# Altium footprint library Miscellaneous THD.PcbLib: 216 footprints (part 7 of 15)
Each footprint in its own frame and in the unit in brackets; x right, y up, seen from the top. Pads: shape width x height; smd on the part's side, far side on the other; paste and mask are expansions set on the pad; w line width, h text height; cw(c..) or ccw(c..) is an arc to the next point about the centre after c.
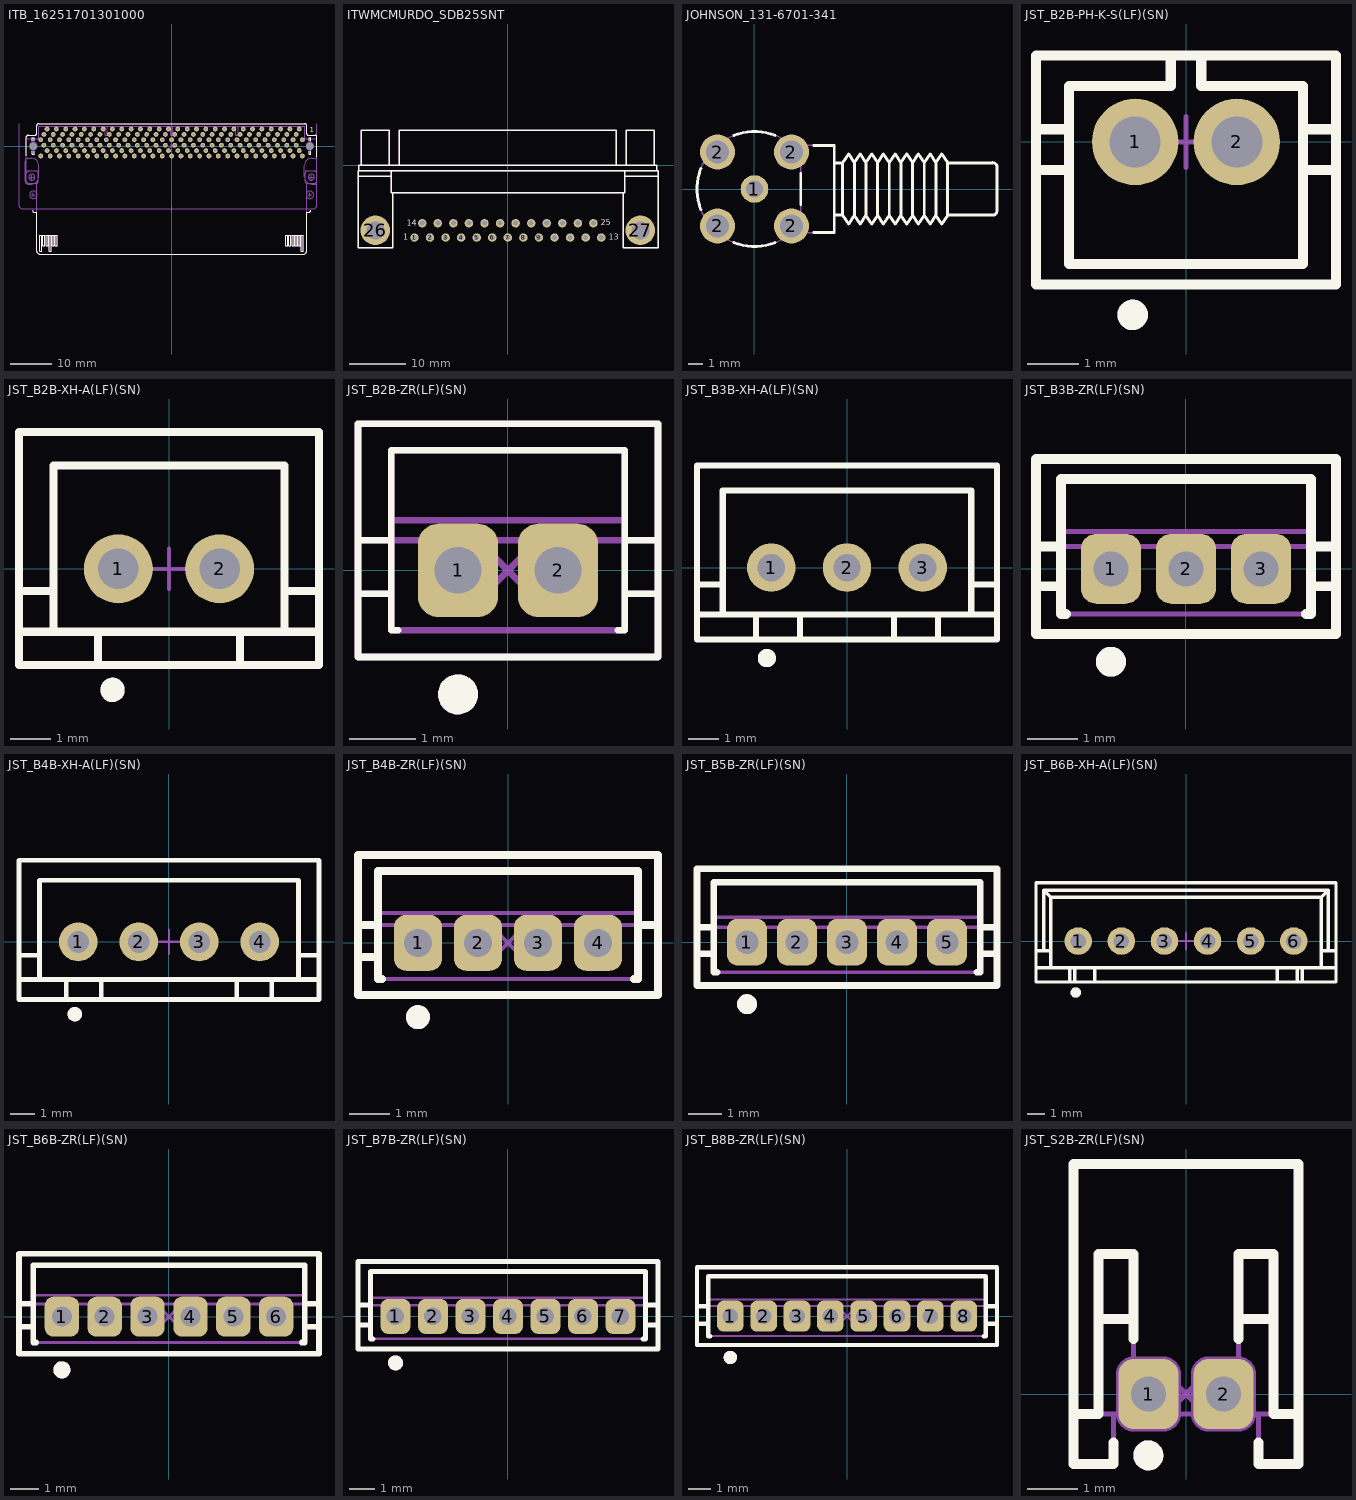
[diagram p6: the footprints below, top view; thin cyan lines are the x and y axes]

## ITB_16251701301000 [mm] "170 Poles, Piggyback Plug Connector (Basic Side)"
height 7.64
pads (172):
  round 1.15 hole 0.55: 1(31.5,1.5) 2(30.75,4.1) 3(30,2.8) 4(29.25,1.5) 5(28.5,4.1) 6(27.75,2.8) 7(27,1.5) 8(26.25,4.1) 9(25.5,2.8) 10(24.75,1.5) 11(24,4.1) 12(23.25,2.8) 13(22.5,1.5) 14(21.75,4.1) 15(21,2.8) 16(20.25,1.5) 17(19.5,4.1) 18(18.75,2.8) 19(18,1.5) 20(17.25,4.1) 21(16.5,2.8) 22(15.75,1.5) 23(15,4.1) 24(14.25,2.8) 25(13.5,1.5) 26(12.75,4.1) 27(12,2.8) 28(11.25,1.5) 29(10.5,4.1) 30(9.75,2.8) 31(9,1.5) 32(8.25,4.1) 33(7.5,2.8) 34(6.75,1.5) 35(6,4.1) 36(5.25,2.8) 37(4.5,1.5) 38(3.75,4.1) 39(3,2.8) 40(2.25,1.5) 41(1.5,4.1) 42(0.75,2.8) 43(0,1.5) 44(-0.75,4.1) 45(-1.5,2.8) 46(-2.25,1.5) 47(-3,4.1) 48(-3.75,2.8) 49(-4.5,1.5) 50(-5.25,4.1) 51(-6,2.8) 52(-6.75,1.5) 53(-7.5,4.1) 54(-8.25,2.8) 55(-9,1.5) 56(-9.75,4.1) 57(-10.5,2.8) 58(-11.25,1.5) 59(-12,4.1) 60(-12.75,2.8) 61(-13.5,1.5) 62(-14.25,4.1) 63(-15,2.8) 64(-15.75,1.5) 65(-16.5,4.1) 66(-17.25,2.8) 67(-18,1.5) 68(-18.75,4.1) 69(-19.5,2.8) 70(-20.25,1.5) 71(-21,4.1) 72(-21.75,2.8) 73(-22.5,1.5) 74(-23.25,4.1) 75(-24,2.8) 76(-24.75,1.5) 77(-25.5,4.1) 78(-26.25,2.8) 79(-27,1.5) 80(-27.75,4.1) 81(-28.5,2.8) 82(-29.25,1.5) 83(-30,4.1) 84(-30.75,2.8) 85(-31.5,1.5) 86(-31.5,-2.4) 87(-30.75,0.2) 88(-30,-1.1) 89(-29.25,-2.4) 90(-28.5,0.2) 91(-27.75,-1.1) 92(-27,-2.4) 93(-26.25,0.2) 94(-25.5,-1.1) 95(-24.75,-2.4) 96(-24,0.2) 97(-23.25,-1.1) 98(-22.5,-2.4) 99(-21.75,0.2) 100(-21,-1.1) 101(-20.25,-2.4) 102(-19.5,0.2) 103(-18.75,-1.1) 104(-18,-2.4) 105(-17.25,0.2) 106(-16.5,-1.1) 107(-15.75,-2.4) 108(-15,0.2) 109(-14.25,-1.1) 110(-13.5,-2.4) 111(-12.75,0.2) 112(-12,-1.1) 113(-11.25,-2.4) 114(-10.5,0.2) 115(-9.75,-1.1) 116(-9,-2.4) 117(-8.25,0.2) 118(-7.5,-1.1) 119(-6.75,-2.4) 120(-6,0.2) 121(-5.25,-1.1) 122(-4.5,-2.4) 123(-3.75,0.2) 124(-3,-1.1) 125(-2.25,-2.4) 126(-1.5,0.2) 127(-0.75,-1.1) 128(0,-2.4) 129(0.75,0.2) 130(1.5,-1.1) 131(2.25,-2.4) 132(3,0.2) 133(3.75,-1.1) 134(4.5,-2.4) 135(5.25,0.2) 136(6,-1.1) 137(6.75,-2.4) 138(7.5,0.2) 139(8.25,-1.1) 140(9,-2.4) 141(9.75,0.2) 142(10.5,-1.1) 143(11.25,-2.4) 144(12,0.2) 145(12.75,-1.1) 146(13.5,-2.4) 147(14.25,0.2) 148(15,-1.1) 149(15.75,-2.4) 150(16.5,0.2) 151(17.25,-1.1) 152(18,-2.4) 153(18.75,0.2) 154(19.5,-1.1) 155(20.25,-2.4) 156(21,0.2) 157(21.75,-1.1) 158(22.5,-2.4) 159(23.25,0.2) 160(24,-1.1) 161(24.75,-2.4) 162(25.5,0.2) 163(26.25,-1.1) 164(27,-2.4) 165(27.75,0.2) 166(28.5,-1.1) 167(29.25,-2.4) 168(30,0.2) 169(30.75,-1.1) 170(31.5,-2.4)
  round 1 hole 1.8 unplated mask+0.4: 171(-33.3,0) 172(33.3,0)
Top Overlay:
  lines w0.2: -34.95,-2.3 -34.95,2.2 cw(c-34.55,2.2) -34.55,2.6 -32.926,2.596 ccw(c-32.931,3.003) -32.525,3 -32.525,4.9 cw(c-32.025,4.9) -32.025,5.4 32.025,5.4 cw(c32.025,4.9) 32.525,4.9 32.525,3 ccw(c32.925,3) 32.925,2.6 34.55,2.6 cw(c34.55,2.2) 34.95,2.2 34.95,-2.75 ; -33.5,-15.5 ccw(c-33,-15.5) -33,-16 -32.525,-16 -32.525,-25.293 ccw(c-32.025,-25.293) -32.379,-25.646 -32.026,-25.994 ccw(c-31.718,-25.6) -31.718,-26.1 31.718,-26.1 ccw(c31.718,-25.6) 32.026,-25.994 32.379,-25.646 ccw(c32.025,-25.293) 32.525,-25.293 32.525,-16 33,-16 ccw(c33,-15.5) 33.5,-15.5 ; -33.5,-1.234 -33.5,-2 -33.1,-2 -33.1,-1.234 ; -33.5,1.234 -33.5,2 -33.1,2 -33.1,1.234 ; 33.1,-1.234 33.1,-2 33.5,-2 33.5,-1.234 ; 33.1,1.234 33.1,2 33.5,2 33.5,1.234 ; -31.74,-25.38 -31.26,-25.38 -31.26,-21.468 -31.74,-21.468 -31.74,-25.38 ; -30.99,-23.98 -30.51,-23.98 -30.51,-21.468 -30.99,-21.468 -30.99,-23.98 ; -30.24,-23.98 -30.24,-21.468 -29.76,-21.468 -29.76,-23.98 -30.24,-23.98 ; -29.49,-25.38 -29.49,-21.468 -29.01,-21.468 -29.01,-25.38 -29.49,-25.38 ; -28.74,-23.98 -28.26,-23.98 -28.26,-21.468 -28.74,-21.468 -28.74,-23.98 ; -27.99,-23.98 -27.99,-21.468 -27.51,-21.468 -27.51,-23.98 -27.99,-23.98 ; 27.51,-23.98 27.99,-23.98 27.99,-21.468 27.51,-21.468 27.51,-23.98 ; 28.26,-23.98 28.74,-23.98 28.74,-21.468 28.26,-21.468 28.26,-23.98 ; 29.01,-23.98 29.49,-23.98 29.49,-21.468 29.01,-21.468 29.01,-23.98 ; 29.76,-23.98 30.24,-23.98 30.24,-21.468 29.76,-21.468 29.76,-23.98 ; 30.51,-23.98 30.99,-23.98 30.99,-21.468 30.51,-21.468 30.51,-23.98 ; 31.26,-25.38 31.74,-25.38 31.74,-21.468 31.26,-21.468 31.26,-25.38
  text "1" at 33.25,3.3 h1.2
Mechanical 8:
  drawing of 735 lines, arcs and shapes, not listed
  text "PCB Edge" at -5.2,-14.4 h1.52
  text "167" at 29.553,-2.214 h0.5
  text "170" at 31.69,-2.201 h0.5
  text "169" at 30.879,-0.767 h0.5
  text "168" at 30.244,0.414 h0.5
  text "1" at 31.62,1.758 h0.5
  text "4" at 29.53,1.748 h0.5
  text "3" at 30.339,3.029 h0.5
  text "2" at 31.189,4.373 h0.5
  text "82" at -28.854,1.645 h0.5
  text "83" at -29.713,4.371 h0.5
  text "84" at -30.367,2.938 h0.5
  text "85" at -31.097,1.636 h0.5
  text "87" at -30.405,0.369 h0.5
  text "88" at -29.75,-0.85 h0.5
  text "89" at -28.931,-2.226 h0.5
  text "86" at -31.156,-2.186 h0.5
Mechanical 14:
  circle w0.1: c33.645,-7.5 r0.735
  circle w0.1: c-33.645,-7.5 r0.735
  lines w0.1: -34.95,-6.5 cw(c-34.45,-6.5) -34.45,-6 -32.65,-6 cw(c-32.65,-6.5) -32.15,-6.5 -32.15,-8.5 cw(c-32.65,-8.5) -32.65,-9 -34.45,-9 cw(c-34.45,-8.5) -34.95,-8.5 -34.95,2.2 cw(c-34.55,2.2) -34.55,2.6 -32.926,2.596 ccw(c-32.931,3.003) -32.525,3 -32.525,4.9 cw(c-32.025,4.9) -32.025,5.4 32.025,5.4 cw(c32.025,4.9) 32.525,4.9 32.525,3 ccw(c32.925,3) 32.925,2.6 34.55,2.6 cw(c34.55,2.2) 34.95,2.2 34.95,-8.5 cw(c34.45,-8.5) 34.45,-9 32.65,-9 cw(c32.65,-8.5) 32.15,-8.5 32.15,-6.5 cw(c32.65,-6.5) 32.65,-6 34.45,-6 cw(c34.45,-6.5) 34.95,-6.5 ; -34.95,1.784 -33.5,1.784 ; -33.1,1.784 -32.025,1.784 -32.025,4.8 32.025,4.8 32.025,1.784 33.1,1.784 ; -32.825,-9 cw(c-32.825,-9.3) -32.525,-9.3 -32.525,-25.293 ccw(c-32.025,-25.293) -32.379,-25.646 -32.026,-25.994 ccw(c-31.718,-25.6) -31.718,-26.1 31.718,-26.1 ccw(c31.718,-25.6) 32.026,-25.994 32.379,-25.646 ccw(c32.025,-25.293) 32.525,-25.293 32.525,-9.3 cw(c32.825,-9.3) 32.825,-9 ; -16,4.779 -16,2.546 -15.5,2.546 -15.5,4.8 ; -0.25,4.8 -0.25,2.546 0.25,2.546 0.25,4.8 ; 15.5,4.8 15.5,2.546 16,2.546 16,4.8 ; 33.5,1.784 34.95,1.784 ; -33.5,-2 -33.1,-2 -33.1,2 -33.5,2 -33.5,-2 ; -31.74,-25.38 -31.74,-21.468 -31.26,-21.468 -31.26,-25.38 -31.74,-25.38 ; -30.99,-23.98 -30.99,-21.468 -30.51,-21.468 -30.51,-23.98 -30.99,-23.98 ; -30.24,-23.98 -29.76,-23.98 -29.76,-21.468 -30.24,-21.468 -30.24,-23.98 ; -29.49,-25.38 -29.01,-25.38 -29.01,-21.468 -29.49,-21.468 -29.49,-25.38 ; -28.74,-23.98 -28.74,-21.468 -28.26,-21.468 -28.26,-23.98 -28.74,-23.98 ; -27.99,-23.98 -27.51,-23.98 -27.51,-21.468 -27.99,-21.468 -27.99,-23.98 ; 27.51,-23.98 27.51,-21.468 27.99,-21.468 27.99,-23.98 27.51,-23.98 ; 28.26,-23.98 28.26,-21.468 28.74,-21.468 28.74,-23.98 28.26,-23.98 ; 29.01,-23.98 29.01,-21.468 29.49,-21.468 29.49,-23.98 29.01,-23.98 ; 29.76,-23.98 29.76,-21.468 30.24,-21.468 30.24,-23.98 29.76,-23.98 ; 30.51,-23.98 30.51,-21.468 30.99,-21.468 30.99,-23.98 30.51,-23.98 ; 31.26,-25.38 31.26,-21.468 31.74,-21.468 31.74,-25.38 31.26,-25.38 ; 33.1,-2 33.1,2 33.5,2 33.5,-2 33.1,-2
  text "1" at 33.25,3.3 h1.2
3D body "ITB_16251701301000.stp": height 7.59, standoff -2.63, extent -34.95,-26.1 34.95,5.4

## ITWMCMURDO_SDB25SNT [mm] "25 Way Right Angled Female D-sub Connector"
height 12.5
pads (27):
  round 1.5 hole 0.9: 1(-16.56,-12.84) 2(-13.8,-12.84) 3(-11.04,-12.84) 4(-8.28,-12.84) 5(-5.52,-12.84) 6(-2.76,-12.84) 7(0,-12.84) 8(2.76,-12.84) 9(5.52,-12.84) 10(8.28,-12.84) 11(11.04,-12.84) 12(13.8,-12.84) 13(16.56,-12.84) 14(-15.18,-10.3) 15(-12.42,-10.3) 16(-9.66,-10.3) 17(-6.9,-10.3) 18(-4.14,-10.3) 19(-1.38,-10.3) 20(1.38,-10.3) 21(4.14,-10.3) 22(6.9,-10.3) 23(9.66,-10.3) 24(12.42,-10.3) 25(15.18,-10.3)
  round 5.25 hole 3.2: 26(-23.5,-11.57) 27(23.5,-11.57)
Top Overlay:
  lines w0.254: -26.571,-2 -20.671,-2 ; -26.45,-1 -26.45,0 26.45,0 26.45,-1 ; -26,0 -26,6.2 -21,6.2 -21,0 ; -20.671,-1 -20.671,-4.9 20.729,-4.9 20.729,-1 ; -20.371,-4.9 -20.371,-14.67 -26.571,-14.67 -26.571,-1 26.629,-1 26.629,-14.67 20.429,-14.67 20.429,-4.9 ; -19.25,0 -19.25,6.2 19.25,6.2 19.25,0 ; 20.729,-2 26.629,-2 ; 21,0 21,6.2 26,6.2 26,0
  text "1" at -18.542,-13.208 h1.02
  text "13" at 17.907,-13.208 h1.02
  text "14" at -17.907,-10.795 h1.02
  text "25" at 16.51,-10.668 h1.02
Mechanical 14:
  lines w0.1: -26.571,-2 -20.671,-2 ; -26.45,-1 -26.45,0 26.45,0 26.45,-1 ; -26,0 -26,6.2 -21,6.2 -21,0 ; -20.671,-1 -20.671,-4.9 20.729,-4.9 20.729,-1 ; -20.371,-4.9 -20.371,-14.67 -26.571,-14.67 -26.571,-1 26.629,-1 26.629,-14.67 20.429,-14.67 20.429,-4.9 ; -19.25,0 -19.25,6.2 19.25,6.2 19.25,0 ; 20.729,-2 26.629,-2 ; 21,0 21,6.2 26,6.2 26,0
  text "1" at -18.542,-13.208 h1.02
  text "13" at 17.907,-13.208 h1.02
  text "14" at -17.907,-10.795 h1.02
  text "25" at 16.51,-10.668 h1.02
3D body "ITWMCMURDO_SDB25SNT.stp": height 12.93, standoff -5, extent -26.71,-14.67 26.71,6.2

## JOHNSON_131-6701-341 [mm] "Right Angle Bulkhead SMC"
height 7.67
pads (5):
  round 1.9 hole 1.2: 1(0,0)
  round 2.4 hole 1.6: 2(-2.54,-2.54) 2(-2.54,2.54) 2(2.54,-2.54) 2(2.54,2.54)
Top Overlay:
  lines w0.2: -3.685,-1.422 cw(c0,0) -3.685,1.422 ; -1.422,-3.685 ccw(c0,0) 1.422,-3.685 ; -1.422,3.685 cw(c0,0) 1.422,3.685 ; 3.18,-1.074 3.18,1.074 ; 4.072,-3 5.48,-3 5.48,3 4.072,3 ; 5.48,-1.8 6.06,-1.8 ; 5.48,1.8 6.06,1.8 ; 6.86,1.8 6.86,-1.81 ; 7.66,1.8 7.66,-1.81 ; 8.46,1.8 8.46,-1.81 ; 9.26,1.8 9.26,-1.81 ; 10.06,1.8 10.06,-1.81 ; 10.86,1.8 10.86,-1.81 ; 11.66,1.8 11.66,-1.81 ; 12.46,1.8 12.46,-1.81 ; 13.26,-1.8 16.36,-1.8 ccw(c16.36,-1.5) 16.66,-1.5 16.66,1.5 ccw(c16.36,1.507) 16.296,1.8 ; 13.26,1.81 12.86,2.41 12.46,1.81 12.06,2.41 11.66,1.81 11.26,2.41 10.86,1.81 10.46,2.41 10.06,1.81 9.66,2.41 9.26,1.81 8.86,2.41 8.46,1.81 8.06,2.41 7.66,1.81 7.26,2.41 6.86,1.81 6.46,2.41 6.06,1.81 6.06,-1.81 6.46,-2.41 6.86,-1.81 ; 16.36,1.8 13.26,1.8 13.26,-1.81 12.86,-2.41 12.46,-1.81 ; 6.86,-1.81 7.26,-2.41 7.66,-1.81 ; 7.66,-1.81 8.06,-2.41 8.46,-1.81 ; 8.46,-1.81 8.86,-2.41 9.26,-1.81 ; 9.26,-1.81 9.66,-2.41 10.06,-1.81 ; 10.06,-1.81 10.46,-2.41 10.86,-1.81 ; 10.86,-1.81 11.26,-2.41 11.66,-1.81 ; 11.66,-1.81 12.06,-2.41 12.46,-1.81
Mechanical 8:
  lines w0.1: -3.04,-2.54 -2.54,-2.54 ; -3.04,2.54 -2.54,2.54 ; -2.54,-3.04 -2.54,-2.54 ; -2.54,-2.04 -2.54,-2.54 ; -2.54,2.04 -2.54,2.54 ; -2.54,3.04 -2.54,2.54 ; -2.04,-2.54 -2.54,-2.54 ; -2.04,2.54 -2.54,2.54 ; -0.5,0 0,0 ; 0,-0.5 0,0 ; 0,0.5 0,0 ; 0.5,0 0,0 ; 2.04,-2.54 2.54,-2.54 ; 2.04,2.54 2.54,2.54 ; 2.54,-3.04 2.54,-2.54 ; 2.54,-2.04 2.54,-2.54 ; 2.54,2.04 2.54,2.54 ; 2.54,3.04 2.54,2.54 ; 3.04,-2.54 2.54,-2.54 ; 3.04,2.54 2.54,2.54
Mechanical 14:
  lines w0.1: 3.18,-2.343 cw(c0,0) 3.18,2.343 ; 5.48,-1.8 6.06,-1.8 ; 5.48,1.8 6.06,1.8 ; 6.86,1.8 6.86,-1.81 ; 7.66,1.8 7.66,-1.81 ; 8.46,1.8 8.46,-1.81 ; 9.26,1.8 9.26,-1.81 ; 10.06,1.8 10.06,-1.81 ; 10.86,1.8 10.86,-1.81 ; 11.66,1.8 11.66,-1.81 ; 12.46,1.8 12.46,-1.81 ; 13.26,-1.8 16.36,-1.8 ccw(c16.36,-1.5) 16.66,-1.5 16.66,1.5 ccw(c16.36,1.507) 16.296,1.8 ; 13.26,1.81 12.86,2.41 12.46,1.81 12.06,2.41 11.66,1.81 11.26,2.41 10.86,1.81 10.46,2.41 10.06,1.81 9.66,2.41 9.26,1.81 8.86,2.41 8.46,1.81 8.06,2.41 7.66,1.81 7.26,2.41 6.86,1.81 6.46,2.41 6.06,1.81 6.06,-1.81 6.46,-2.41 6.86,-1.81 ; 16.36,1.8 13.26,1.8 13.26,-1.81 12.86,-2.41 12.46,-1.81 ; 6.86,-1.81 7.26,-2.41 7.66,-1.81 ; 7.66,-1.81 8.06,-2.41 8.46,-1.81 ; 8.46,-1.81 8.86,-2.41 9.26,-1.81 ; 9.26,-1.81 9.66,-2.41 10.06,-1.81 ; 10.06,-1.81 10.46,-2.41 10.86,-1.81 ; 10.86,-1.81 11.26,-2.41 11.66,-1.81 ; 11.66,-1.81 12.06,-2.41 12.46,-1.81 ; 3.18,-3 5.48,-3 5.48,3 3.18,3 3.18,-3
3D body "JOHNSON_131-6701-341_Part1.stp": height 7.67, standoff -3.9, extent -3.943,-3.945 16.66,3.943
3D body "JOHNSON_131-6701-341_Part2.stp": height 8.3, standoff 0.7, extent 7.84,-3.8 10.14,3.8

## JST_B2B-PH-K-S(LF)(SN) [mm] "2mm Pitch, 2 Contacts Through-Hole Top Entry Type Shrouded Header"
height 6
pads (2):
  round 1.7 hole 1: 1(-1,0) 2(1,0)
Top Overlay:
  circle w0.3: c-1.05,-3.4 r0.15
  lines w0.2: -2.95,-0.55 -2.3,-0.55 ; -2.95,0.25 -2.3,0.25 ; -0.3,1.7 -0.3,1.1 -2.3,1.1 -2.3,-2.4 2.3,-2.4 2.3,1.1 0.3,1.1 0.3,1.7 ; 2.3,-0.55 2.95,-0.55 ; 2.3,0.25 2.95,0.25 ; -2.95,-2.8 2.95,-2.8 2.95,1.7 -2.95,1.7 -2.95,-2.8
Mechanical 8:
  lines w0.1: -1.5,0 -1,0 ; -1,-0.5 -1,0 ; -1,0.5 -1,0 ; 0,-0.5 0,0 ; 0,0.5 0,0 ; 1,-0.5 1,0 ; 1,0.5 1,0 ; 1.5,0 1,0 ; -1,0 -0.5,0 0,0 ; 0,0 0.5,0 1,0
Mechanical 14:
  circle w0.3: c-1.05,-3.4 r0.15
  lines w0.1: -2.95,-0.55 -2.3,-0.55 ; -2.95,0.25 -2.3,0.25 ; -0.3,1.7 -0.3,1.1 -2.3,1.1 -2.3,-2.4 2.3,-2.4 2.3,1.1 0.3,1.1 0.3,1.7 ; 2.3,-0.55 2.95,-0.55 ; 2.3,0.25 2.95,0.25 ; -2.95,-2.8 2.95,-2.8 2.95,1.7 -2.95,1.7 -2.95,-2.8 ; -1.25,-0.25 -1.25,0.25 -0.75,0.25 -0.75,-0.25 -1.25,-0.25 ; 0.75,-0.25 1.25,-0.25 1.25,0.25 0.75,0.25 0.75,-0.25
3D body "JST_B2B-PH-K-S(LF)(SN).stp": height 6, standoff -3.4, extent -2.95,-2.8 2.95,1.7

## JST_B2B-XH-A(LF)(SN) [mm] "2.5mm Pitch, 2 Contacts Top Entry Type Shrouded Header"
height 7
pads (2):
  round 1.7 hole 1: 1(-1.25,0) 2(1.25,0)
Top Overlay:
  circle w0.3: c-1.395,-2.985 r0.15
  lines w0.2: -3.7,-1.55 -2.85,-1.55 ; -3.7,-0.55 -2.85,-0.55 ; -1.75,-2.375 -1.75,-1.55 ; 1.75,-2.375 1.75,-1.55 ; 2.85,-0.55 3.7,-0.55 ; 3.7,-1.55 2.85,-1.55 ; -2.85,-1.55 2.85,-1.55 ; -2.85,-1.55 -2.85,2.55 2.85,2.55 2.85,-1.55 ; -3.7,-2.375 -3.7,3.375 3.7,3.375 3.7,-2.375 -3.7,-2.375
Mechanical 8:
  lines w0.1: -1.75,0 -1.25,0 ; -1.25,-0.5 -1.25,0 ; -1.25,0.5 -1.25,0 ; -0.75,0 -1.25,0 ; -0.5,0 0,0 ; 0,-0.5 0,0 ; 0,0.5 0,0 ; 0.5,0 0,0 ; 0.75,0 1.25,0 ; 1.25,-0.5 1.25,0 ; 1.25,0.5 1.25,0 ; 1.75,0 1.25,0
Mechanical 14:
  circle w0.3: c-1.395,-2.985 r0.15
  lines w0.1: -3.7,-1.55 -2.85,-1.55 ; -3.7,-0.55 -2.85,-0.55 ; -1.75,-2.375 -1.75,-1.55 ; 1.75,-2.375 1.75,-1.55 ; 2.85,-0.55 3.7,-0.55 ; 3.7,-1.55 2.85,-1.55 ; -2.85,-1.55 2.85,-1.55 ; -2.85,-1.55 -2.85,2.55 2.85,2.55 2.85,-1.55 ; -3.7,-2.375 -3.7,3.375 3.7,3.375 3.7,-2.375 -3.7,-2.375
3D body "JST_B2B-XH-A(LF)(SN).stp": height 7, standoff -3.4, extent -3.7,-2.375 3.7,3.375

## JST_B2B-ZR(LF)(SN) [mm] "1.5mm Pitch, 2 Contacts Top Entry Shrouded Header"
height 4.5
pads (2):
  rrect50% 1.2x1.4 hole 0.7: 1(-0.75,0) 2(0.75,0)
Top Overlay:
  circle w0.3: c-0.75,-1.86 r0.15
  lines w0.1: -2.25,-0.35 -1.75,-0.35 ; -2.25,0.45 -1.75,0.45 ; -1.65,-0.9 -1.75,-0.9 -1.75,1.8 1.75,1.8 1.75,-0.9 1.65,-0.9 ; 1.75,-0.35 2.25,-0.35 ; 1.75,0.45 2.25,0.45 ; -2.25,-1.3 -2.25,2.2 2.25,2.2 2.25,-1.3 -2.25,-1.3
Mechanical 8:
  lines w0.1: -1.25,0 -0.75,0 ; -0.75,-0.5 -0.75,0 ; -0.75,0.5 -0.75,0 ; -0.354,-0.354 0,0 ; -0.354,0.354 0,0 ; -0.25,0 -0.75,0 ; 0.25,0 0.75,0 ; 0.354,-0.354 0,0 ; 0.354,0.354 0,0 ; 0.75,-0.5 0.75,0 ; 0.75,0.5 0.75,0 ; 1.25,0 0.75,0
Mechanical 14:
  circle w0.1: c-0.75,0 r0.25
  circle w0.1: c0.75,0 r0.25
  circle w0.3: c-0.75,-1.86 r0.15
  lines w0.1: -2.25,-0.35 -1.75,-0.35 ; -2.25,0.45 -1.75,0.45 1.75,0.45 2.25,0.45 ; -1.75,0.75 1.75,0.75 ; 1.75,-0.35 2.25,-0.35 ; -2.25,-1.3 2.25,-1.3 2.25,2.2 -2.25,2.2 -2.25,-1.3 ; -1.75,-0.9 -1.75,1.8 1.75,1.8 1.75,-0.9 -1.75,-0.9
3D body "JST_B2B-ZR(LF)(SN).stp": height 4.5, standoff -2.7, extent -2.25,-1.3 2.25,2.2

## JST_B3B-XH-A(LF)(SN) [mm] "2.5mm Pitch, 3 Contacts Top Entry Type Shrouded Header"
height 7
pads (3):
  round 1.6 hole 0.9: 1(-2.5,0) 2(0,0) 3(2.5,0)
Top Overlay:
  circle w0.3: c-2.645,-2.985 r0.15
  lines w0.2: -4.95,-1.55 4.95,-1.55 ; -4.95,-0.55 -4.1,-0.55 ; -4.1,-1.55 -4.1,2.55 4.1,2.55 4.1,-1.55 ; -3,-2.375 -3,-1.55 ; -1.55,-2.375 -1.55,-1.55 ; 1.55,-2.375 1.55,-1.55 ; 3,-2.375 3,-1.55 ; 4.1,-0.55 4.95,-0.55 ; -4.95,-2.375 -4.95,3.375 4.95,3.375 4.95,-2.375 -4.95,-2.375
Mechanical 8:
  lines w0.1: -3,0 -2.5,0 ; -2.5,-0.5 -2.5,0 ; -2.5,0.5 -2.5,0 ; -2,0 -2.5,0 ; -0.5,0 0,0 ; 0,-0.5 0,0 ; 0,0.5 0,0 ; 0.5,0 0,0 ; 2,0 2.5,0 ; 2.5,-0.5 2.5,0 ; 2.5,0.5 2.5,0 ; 3,0 2.5,0
Mechanical 14:
  circle w0.3: c-2.645,-2.985 r0.15
  lines w0.1: -4.95,-1.55 4.95,-1.55 ; -4.95,-0.55 -4.1,-0.55 ; -4.1,-1.55 -4.1,2.55 4.1,2.55 4.1,-1.55 ; -3,-2.375 -3,-1.55 ; -1.55,-2.375 -1.55,-1.55 ; 1.55,-2.375 1.55,-1.55 ; 3,-2.375 3,-1.55 ; 4.1,-0.55 4.95,-0.55 ; -4.95,-2.375 -4.95,3.375 4.95,3.375 4.95,-2.375 -4.95,-2.375
3D body "JST_B3B-XH-A(LF)(SN).stp": height 7, standoff -3.4, extent -4.95,-2.375 4.95,3.375

## JST_B3B-ZR(LF)(SN) [mm] "1.5mm Pitch, 3 Contacts Top Entry Shrouded Header"
height 4.5
pads (3):
  rrect50% 1.2x1.4 hole 0.7: 1(-1.5,0) 2(0,0) 3(1.5,0)
Top Overlay:
  circle w0.3: c-1.5,-1.86 r0.15
  lines w0.2: -3,-0.35 -2.5,-0.35 ; -3,0.45 -2.5,0.45 ; -2.4,-0.9 -2.5,-0.9 -2.5,1.8 2.5,1.8 2.5,-0.9 2.4,-0.9 ; 2.5,-0.35 3,-0.35 ; 2.5,0.45 3,0.45 ; -3,-1.3 3,-1.3 3,2.2 -3,2.2 -3,-1.3
Mechanical 8:
  lines w0.1: -2,0 -1.5,0 ; -1.5,-0.5 -1.5,0 ; -1.5,0.5 -1.5,0 ; -1,0 -1.5,0 ; -0.5,0 0,0 ; 0,-0.5 0,0 ; 0,0.5 0,0 ; 0.5,0 0,0 ; 1,0 1.5,0 ; 1.5,-0.5 1.5,0 ; 1.5,0.5 1.5,0 ; 2,0 1.5,0
Mechanical 14:
  circle w0.1: c-1.5,0 r0.25
  circle w0.1: c0,0 r0.25
  circle w0.1: c1.5,0 r0.25
  circle w0.3: c-1.5,-1.86 r0.15
  lines w0.1: -3,-0.35 -2.5,-0.35 ; -3,0.45 -2.5,0.45 2.5,0.45 3,0.45 ; -2.5,0.75 2.5,0.75 ; 2.5,-0.35 3,-0.35 ; -3,-1.3 3,-1.3 3,2.2 -3,2.2 -3,-1.3 ; -2.5,-0.9 -2.5,1.8 2.5,1.8 2.5,-0.9 -2.5,-0.9
3D body "JST_B3B-ZR(LF)(SN).stp": height 4.5, standoff -2.7, extent -3,-1.3 3,2.2

## JST_B4B-XH-A(LF)(SN) [mm] "2.5mm Pitch, 4 Contacts Top Entry Type Shrouded Header"
height 7
pads (4):
  round 1.6 hole 0.9: 1(-3.75,0) 2(-1.25,0) 3(1.25,0) 4(3.75,0)
Top Overlay:
  circle w0.3: c-3.895,-2.985 r0.15
  lines w0.2: -6.2,-1.55 6.2,-1.55 ; -6.2,-0.55 -5.35,-0.55 ; -5.35,-1.55 -5.35,2.55 5.35,2.55 5.35,-1.55 ; -4.25,-2.375 -4.25,-1.55 ; -2.8,-2.375 -2.8,-1.55 ; 2.8,-2.375 2.8,-1.55 ; 4.25,-2.375 4.25,-1.55 ; 5.35,-0.55 6.2,-0.55 ; -6.2,-2.375 6.2,-2.375 6.2,3.375 -6.2,3.375 -6.2,-2.375
Mechanical 8:
  lines w0.1: -4.25,0 -3.75,0 ; -3.75,-0.5 -3.75,0 ; -3.75,0.5 -3.75,0 ; -3.25,0 -3.75,0 ; -1.75,0 -1.25,0 ; -1.25,-0.5 -1.25,0 ; -1.25,0.5 -1.25,0 ; -0.75,0 -1.25,0 ; -0.5,0 0,0 ; 0,-0.5 0,0 ; 0,0.5 0,0 ; 0.5,0 0,0 ; 0.75,0 1.25,0 ; 1.25,-0.5 1.25,0 ; 1.25,0.5 1.25,0 ; 1.75,0 1.25,0 ; 3.25,0 3.75,0 ; 3.75,-0.5 3.75,0 ; 3.75,0.5 3.75,0 ; 4.25,0 3.75,0
Mechanical 14:
  circle w0.3: c-3.895,-2.985 r0.15
  lines w0.1: -6.2,-1.55 6.2,-1.55 ; -6.2,-0.55 -5.35,-0.55 ; -5.35,-1.55 -5.35,2.55 5.35,2.55 5.35,-1.55 ; -4.25,-2.375 -4.25,-1.55 ; -2.8,-2.375 -2.8,-1.55 ; 2.8,-2.375 2.8,-1.55 ; 4.25,-2.375 4.25,-1.55 ; 5.35,-0.55 6.2,-0.55 ; -6.2,-2.375 6.2,-2.375 6.2,3.375 -6.2,3.375 -6.2,-2.375
3D body "JST_B4B-XH-A(LF)(SN).stp": height 7, standoff -3.4, extent -6.2,-2.375 6.2,3.375

## JST_B4B-ZR(LF)(SN) [mm] "1.5mm Pitch, 4 Contacts Top Entry Shrouded Header"
height 4.5
pads (4):
  rrect50% 1.2x1.4 hole 0.7: 1(-2.25,0) 2(-0.75,0) 3(0.75,0) 4(2.25,0)
Top Overlay:
  circle w0.3: c-2.25,-1.86 r0.15
  lines w0.2: -3.75,-0.35 -3.25,-0.35 ; -3.75,0.45 -3.25,0.45 ; -3.15,-0.9 -3.25,-0.9 -3.25,1.8 3.25,1.8 3.25,-0.9 3.15,-0.9 ; 3.25,0.45 3.75,0.45 ; -3.75,-1.3 -3.75,2.2 3.75,2.2 3.75,-1.3 -3.75,-1.3
Mechanical 8:
  lines w0.1: -2.75,0 -2.25,0 ; -2.25,-0.5 -2.25,0 ; -2.25,0.5 -2.25,0 ; -1.75,0 -2.25,0 ; -1.25,0 -0.75,0 ; -0.75,-0.5 -0.75,0 ; -0.75,0.5 -0.75,0 ; -0.354,-0.354 0,0 ; -0.354,0.354 0,0 ; -0.25,0 -0.75,0 ; 0.25,0 0.75,0 ; 0.354,-0.354 0,0 ; 0.354,0.354 0,0 ; 0.75,-0.5 0.75,0 ; 0.75,0.5 0.75,0 ; 1.25,0 0.75,0 ; 1.75,0 2.25,0 ; 2.25,-0.5 2.25,0 ; 2.25,0.5 2.25,0 ; 2.75,0 2.25,0
Mechanical 14:
  circle w0.1: c-2.25,0 r0.25
  circle w0.1: c-0.75,0 r0.25
  circle w0.1: c0.75,0 r0.25
  circle w0.1: c2.25,0 r0.25
  circle w0.3: c-2.25,-1.86 r0.15
  lines w0.1: -3.75,-0.35 -3.25,-0.35 ; -3.75,0.45 -3.25,0.45 3.25,0.45 3.75,0.45 ; -3.25,0.75 3.25,0.75 ; -3.75,-1.3 -3.75,2.2 3.75,2.2 3.75,-1.3 -3.75,-1.3 ; -3.25,-0.9 -3.25,1.8 3.25,1.8 3.25,-0.9 -3.25,-0.9
3D body "JST_B4B-ZR(LF)(SN).stp": height 4.5, standoff -2.7, extent -3.75,-1.3 3.75,2.2

## JST_B5B-ZR(LF)(SN) [mm] "1.5mm Pitch, 5 Contacts Top Entry Shrouded Header"
height 4.5
pads (5):
  rrect50% 1.2x1.4 hole 0.7: 1(-3,0) 2(-1.5,0) 3(0,0) 4(1.5,0) 5(3,0)
Top Overlay:
  circle w0.3: c-3,-1.86 r0.15
  lines w0.2: -4.5,-0.35 -4,-0.35 ; -4.5,0.45 -4,0.45 ; -3.9,-0.9 -4,-0.9 -4,1.8 4,1.8 4,-0.9 3.9,-0.9 ; 4,-0.35 4.5,-0.35 ; 4,0.45 4.5,0.45 ; -4.5,-1.3 -4.5,2.2 4.5,2.2 4.5,-1.3 -4.5,-1.3
Mechanical 8:
  lines w0.1: -3.5,0 -3,0 ; -3,-0.5 -3,0 ; -3,0.5 -3,0 ; -2.5,0 -3,0 ; -2,0 -1.5,0 ; -1.5,-0.5 -1.5,0 ; -1.5,0.5 -1.5,0 ; -1,0 -1.5,0 ; -0.5,0 0,0 ; 0,-0.5 0,0 ; 0,0.5 0,0 ; 0.5,0 0,0 ; 1,0 1.5,0 ; 1.5,-0.5 1.5,0 ; 1.5,0.5 1.5,0 ; 2,0 1.5,0 ; 2.5,0 3,0 ; 3,-0.5 3,0 ; 3,0.5 3,0 ; 3.5,0 3,0
Mechanical 14:
  circle w0.1: c-3,0 r0.25
  circle w0.1: c-1.5,0 r0.25
  circle w0.1: c0,0 r0.25
  circle w0.1: c1.5,0 r0.25
  circle w0.1: c3,0 r0.25
  circle w0.3: c-3,-1.86 r0.15
  lines w0.1: -4.5,-0.35 -4,-0.35 ; -4.5,0.45 -4,0.45 4,0.45 4.5,0.45 ; -4,0.75 4,0.75 ; 4,-0.35 4.5,-0.35 ; -4.5,-1.3 -4.5,2.2 4.5,2.2 4.5,-1.3 -4.5,-1.3 ; -4,-0.9 -4,1.8 4,1.8 4,-0.9 -4,-0.9
3D body "JST_B5B-ZR(LF)(SN).stp": height 4.5, standoff -2.7, extent -4.5,-1.3 4.5,2.2

## JST_B6B-XH-A(LF)(SN) [mm] "2.5mm Pitch, 6 Contacts Top Entry Type Shrouded Header"
height 7
pads (6):
  round 1.6 hole 0.9: 1(-6.25,0) 2(-3.75,0) 3(-1.25,0) 4(1.25,0) 5(3.75,0) 6(6.25,0)
Top Overlay:
  circle w0.3: c-6.395,-2.985 r0.15
  lines w0.2: -8.7,-1.55 8.7,-1.55 ; -8.7,-0.55 -7.85,-0.55 ; -8.25,-0.55 -8.25,2.95 ; -7.85,-1.55 -7.85,2.55 ; -6.75,-2.375 -6.75,-1.55 ; -6.45,-2.375 -6.45,-1.55 ; -5.3,-2.375 -5.3,-1.55 ; 5.3,-2.375 5.3,-1.55 ; 6.461,-2.375 6.461,-1.55 ; 6.75,-2.375 6.75,-1.55 ; 7.85,-1.55 7.85,2.55 ; 7.85,-0.55 8.7,-0.55 ; 8.25,-0.55 8.25,2.95 ; -8.25,2.95 -7.85,2.55 ; -8.25,2.95 8.25,2.95 ; -7.85,2.55 7.85,2.55 ; 7.85,2.55 8.25,2.95 ; -8.7,-2.375 -8.7,3.375 8.7,3.375 8.7,-2.375 -8.7,-2.375
Mechanical 8:
  lines w0.1: -6.75,0 -6.25,0 ; -6.25,-0.5 -6.25,0 ; -6.25,0.5 -6.25,0 ; -5.75,0 -6.25,0 ; -4.25,0 -3.75,0 ; -3.75,-0.5 -3.75,0 ; -3.75,0.5 -3.75,0 ; -3.25,0 -3.75,0 ; -1.75,0 -1.25,0 ; -1.25,-0.5 -1.25,0 ; -1.25,0.5 -1.25,0 ; -0.75,0 -1.25,0 ; -0.5,0 0,0 ; 0,-0.5 0,0 ; 0,0.5 0,0 ; 0.5,0 0,0 ; 0.75,0 1.25,0 ; 1.25,-0.5 1.25,0 ; 1.25,0.5 1.25,0 ; 1.75,0 1.25,0 ; 3.25,0 3.75,0 ; 3.75,-0.5 3.75,0 ; 3.75,0.5 3.75,0 ; 4.25,0 3.75,0 ; 5.75,0 6.25,0 ; 6.25,-0.5 6.25,0 ; 6.25,0.5 6.25,0 ; 6.75,0 6.25,0
Mechanical 14:
  circle w0.3: c-6.395,-2.985 r0.15
  lines w0.1: -8.7,-1.55 8.7,-1.55 ; -8.7,-0.55 -7.85,-0.55 ; -8.25,-0.55 -8.25,2.95 ; -7.85,-1.55 -7.85,2.55 ; -6.75,-2.375 -6.75,-1.55 ; -6.45,-2.375 -6.45,-1.55 ; -5.3,-2.375 -5.3,-1.55 ; 5.3,-2.375 5.3,-1.55 ; 6.461,-2.375 6.461,-1.55 ; 6.75,-2.375 6.75,-1.55 ; 7.85,-1.55 7.85,2.55 ; 7.85,-0.55 8.7,-0.55 ; 8.25,-0.55 8.25,2.95 ; -8.25,2.95 -7.85,2.55 ; -8.25,2.95 8.25,2.95 ; -7.85,2.55 7.85,2.55 ; 7.85,2.55 8.25,2.95 ; -8.7,-2.375 -8.7,3.375 8.7,3.375 8.7,-2.375 -8.7,-2.375 ; -6.57,-0.32 -6.57,0.32 -5.93,0.32 -5.93,-0.32 -6.57,-0.32 ; -4.07,-0.32 -4.07,0.32 -3.43,0.32 -3.43,-0.32 -4.07,-0.32 ; -1.57,-0.32 -1.57,0.32 -0.93,0.32 -0.93,-0.32 -1.57,-0.32 ; 0.93,-0.32 0.93,0.32 1.57,0.32 1.57,-0.32 0.93,-0.32 ; 3.43,-0.32 3.43,0.32 4.07,0.32 4.07,-0.32 3.43,-0.32 ; 5.93,-0.32 5.93,0.32 6.57,0.32 6.57,-0.32 5.93,-0.32
3D body "JST_B6B-XH-A(LF)(SN).stp": height 7, standoff -3.4, extent -8.7,-2.375 8.7,3.375

## JST_B6B-ZR(LF)(SN) [mm] "1.5mm Pitch, 6 Contacts Top Entry Shrouded Header"
height 4.5
pads (6):
  rrect50% 1.2x1.4 hole 0.7: 1(-3.75,0) 2(-2.25,0) 3(-0.75,0) 4(0.75,0) 5(2.25,0) 6(3.75,0)
Top Overlay:
  circle w0.3: c-3.75,-1.86 r0.15
  lines w0.2: -5.25,-0.35 -4.75,-0.35 ; -5.25,0.45 -4.75,0.45 ; -4.65,-0.9 -4.75,-0.9 -4.75,1.8 4.75,1.8 4.75,-0.9 4.65,-0.9 ; 4.75,-0.35 5.25,-0.35 ; 4.75,0.45 5.25,0.45 ; -5.25,-1.3 5.25,-1.3 5.25,2.2 -5.25,2.2 -5.25,-1.3
Mechanical 8:
  lines w0.1: -4.25,0 -3.75,0 ; -3.75,-0.5 -3.75,0 ; -3.75,0.5 -3.75,0 ; -3.25,0 -3.75,0 ; -2.75,0 -2.25,0 ; -2.25,-0.5 -2.25,0 ; -2.25,0.5 -2.25,0 ; -1.75,0 -2.25,0 ; -1.25,0 -0.75,0 ; -0.75,-0.5 -0.75,0 ; -0.75,0.5 -0.75,0 ; -0.354,-0.354 0,0 ; -0.354,0.354 0,0 ; -0.25,0 -0.75,0 ; 0.25,0 0.75,0 ; 0.354,-0.354 0,0 ; 0.354,0.354 0,0 ; 0.75,-0.5 0.75,0 ; 0.75,0.5 0.75,0 ; 1.25,0 0.75,0 ; 1.75,0 2.25,0 ; 2.25,-0.5 2.25,0 ; 2.25,0.5 2.25,0 ; 2.75,0 2.25,0 ; 3.25,0 3.75,0 ; 3.75,-0.5 3.75,0 ; 3.75,0.5 3.75,0 ; 4.25,0 3.75,0
Mechanical 14:
  circle w0.3: c-3.75,-1.86 r0.15
  circle w0.1: c3.75,0 r0.25
  circle w0.1: c2.25,0 r0.25
  circle w0.1: c0.75,0 r0.25
  circle w0.1: c-0.75,0 r0.25
  circle w0.1: c-2.25,0 r0.25
  circle w0.1: c-3.75,0 r0.25
  lines w0.1: -5.25,-0.35 -4.75,-0.35 ; -5.25,0.45 -4.75,0.45 4.75,0.45 5.25,0.45 ; -4.75,0.75 4.75,0.75 ; 4.75,-0.35 5.25,-0.35 ; -5.25,-1.3 5.25,-1.3 5.25,2.2 -5.25,2.2 -5.25,-1.3 ; -4.75,-0.9 4.75,-0.9 4.75,1.8 -4.75,1.8 -4.75,-0.9
3D body "JST_B6B-ZR(LF)(SN).stp": height 4.5, standoff -2.7, extent -5.25,-1.3 5.25,2.2

## JST_B7B-ZR(LF)(SN) [mm] "1.5mm Pitch, 7 Contacts Top Entry Shrouded Header"
height 4.5
pads (7):
  rrect50% 1.2x1.4 hole 0.7: 1(-4.5,0) 2(-3,0) 3(-1.5,0) 4(0,0) 5(1.5,0) 6(3,0) 7(4.5,0)
Top Overlay:
  circle w0.3: c-4.5,-1.86 r0.15
  lines w0.2: -6,-0.35 -5.5,-0.35 ; -6,0.45 -5.5,0.45 ; -5.4,-0.9 -5.5,-0.9 -5.5,1.8 5.5,1.8 5.5,-0.9 5.4,-0.9 ; 5.5,-0.35 6,-0.35 ; 5.5,0.45 6,0.45 ; -6,-1.3 6,-1.3 6,2.2 -6,2.2 -6,-1.3
Mechanical 8:
  lines w0.1: -5,0 -4.5,0 ; -4.5,-0.5 -4.5,0 ; -4.5,0.5 -4.5,0 ; -4,0 -4.5,0 ; -3.5,0 -3,0 ; -3,-0.5 -3,0 ; -3,0.5 -3,0 ; -2.5,0 -3,0 ; -2,0 -1.5,0 ; -1.5,-0.5 -1.5,0 ; -1.5,0.5 -1.5,0 ; -1,0 -1.5,0 ; -0.5,0 0,0 ; 0,-0.5 0,0 ; 0,0.5 0,0 ; 0.5,0 0,0 ; 1,0 1.5,0 ; 1.5,-0.5 1.5,0 ; 1.5,0.5 1.5,0 ; 2,0 1.5,0 ; 2.5,0 3,0 ; 3,-0.5 3,0 ; 3,0.5 3,0 ; 3.5,0 3,0 ; 4,0 4.5,0 ; 4.5,-0.5 4.5,0 ; 4.5,0.5 4.5,0 ; 5,0 4.5,0
Mechanical 14:
  circle w0.3: c-4.5,-1.86 r0.15
  circle w0.1: c4.5,0 r0.25
  circle w0.1: c3,0 r0.25
  circle w0.1: c1.5,0 r0.25
  circle w0.1: c0,0 r0.25
  circle w0.1: c-1.5,0 r0.25
  circle w0.1: c-3,0 r0.25
  circle w0.1: c-4.5,0 r0.25
  lines w0.1: -6,-0.35 -5.5,-0.35 ; -6,0.45 -5.5,0.45 5.5,0.45 6,0.45 ; -5.5,0.75 5.5,0.75 ; 5.5,-0.35 6,-0.35 ; -6,-1.3 6,-1.3 6,2.2 -6,2.2 -6,-1.3 ; -5.5,-0.9 5.5,-0.9 5.5,1.8 -5.5,1.8 -5.5,-0.9
3D body "JST_B7B-ZR(LF)(SN).stp": height 4.5, standoff -2.7, extent -6,-1.3 6,2.2

## JST_B8B-ZR(LF)(SN) [mm] "1.5mm Pitch, 8 Contacts Top Entry Shrouded Header"
height 4.5
pads (8):
  rrect50% 1.2x1.4 hole 0.7: 1(-5.25,0) 2(-3.75,0) 3(-2.25,0) 4(-0.75,0) 5(0.75,0) 6(2.25,0) 7(3.75,0) 8(5.25,0)
Top Overlay:
  circle w0.3: c-5.25,-1.86 r0.15
  lines w0.2: -6.75,-0.35 -6.25,-0.35 ; -6.75,0.45 -6.25,0.45 ; -6.15,-0.9 -6.25,-0.9 -6.25,1.8 6.25,1.8 6.25,-0.9 6.15,-0.9 ; 6.25,-0.35 6.75,-0.35 ; 6.25,0.45 6.75,0.45 ; -6.75,-1.3 6.75,-1.3 6.75,2.2 -6.75,2.2 -6.75,-1.3
Mechanical 8:
  lines w0.1: -5.75,0 -5.25,0 ; -5.25,-0.5 -5.25,0 ; -5.25,0.5 -5.25,0 ; -4.75,0 -5.25,0 ; -4.25,0 -3.75,0 ; -3.75,-0.5 -3.75,0 ; -3.75,0.5 -3.75,0 ; -3.25,0 -3.75,0 ; -2.75,0 -2.25,0 ; -2.25,-0.5 -2.25,0 ; -2.25,0.5 -2.25,0 ; -1.75,0 -2.25,0 ; -0.354,-0.354 0,0 ; -0.354,0.354 0,0 ; 0.25,0 0.75,0 ; 0.354,-0.354 0,0 ; 0.354,0.354 0,0 ; 0.75,-0.5 0.75,0 ; 0.75,0.5 0.75,0 ; 1.25,0 0.75,0 ; 1.75,0 2.25,0 ; 2.25,-0.5 2.25,0 ; 2.25,0.5 2.25,0 ; 2.75,0 2.25,0 ; 3.25,0 3.75,0 ; 3.75,-0.5 3.75,0 ; 3.75,0.5 3.75,0 ; 4.25,0 3.75,0 ; 4.75,0 5.25,0 ; 5.25,-0.5 5.25,0 ; 5.25,0.5 5.25,0 ; 5.75,0 5.25,0 ; -0.75,0 -0.25,0 -0.75,0 ; -0.75,0 -0.75,-0.5 -0.75,0 ; -0.75,0 -0.75,0.5 -0.75,0 ; -0.75,0 -1.25,0 -0.75,0
Mechanical 14:
  circle w0.3: c-5.25,-1.86 r0.15
  circle w0.1: c5.25,0 r0.25
  circle w0.1: c3.75,0 r0.25
  circle w0.1: c2.25,0 r0.25
  circle w0.1: c0.75,0 r0.25
  circle w0.1: c-0.75,0 r0.25
  circle w0.1: c-2.25,0 r0.25
  circle w0.1: c-3.75,0 r0.25
  circle w0.1: c-5.25,0 r0.25
  lines w0.1: -6.75,-0.35 -6.25,-0.35 ; -6.75,0.45 -6.25,0.45 6.25,0.45 6.75,0.45 ; -6.25,0.75 6.25,0.75 ; 6.25,-0.35 6.75,-0.35 ; -6.75,-1.3 6.75,-1.3 6.75,2.2 -6.75,2.2 -6.75,-1.3 ; -6.25,-0.9 -6.25,1.8 6.25,1.8 6.25,-0.9 -6.25,-0.9
3D body "JST_B8B-ZR(LF)(SN).stp": height 4.5, standoff -2.7, extent -6.775,-1.275 6.725,2.225

## JST_S2B-ZR(LF)(SN) [mm] "1.5mm Pitch, 2 Contacts Right Angle Shrouded Header"
height 3.7
pads (2):
  rrect50% 1.2x1.4 hole 0.7: 1(-0.75,0) 2(0.75,0)
Top Overlay:
  circle w0.3: c-0.753,-1.228 r0.15
  lines w0.2: -2.25,-0.4 -1.75,-0.4 -1.75,2.8 -1.05,2.8 -1.05,1.1 ; -1.75,1.5 -1.05,1.5 ; -1.45,-0.974 -1.45,-1.4 -2.25,-1.4 -2.25,4.6 2.25,4.6 2.25,-1.4 1.45,-1.4 1.45,-0.974 ; 1.05,1.1 1.05,2.8 1.75,2.8 1.75,-0.4 2.25,-0.4 ; 1.05,1.5 1.75,1.5
Mechanical 8:
  circle w0.1: c0.75,0 r0.35
  circle w0.1: c-0.75,0 r0.35
  lines w0.1: -1.25,0 -0.75,0 ; -0.75,-0.5 -0.75,0 ; -0.75,0.5 -0.75,0 ; -0.354,-0.354 0,0 ; -0.354,0.354 0,0 ; -0.25,0 -0.75,0 ; 0.25,0 0.75,0 ; 0.354,-0.354 0,0 ; 0.354,0.354 0,0 ; 0.75,-0.5 0.75,0 ; 0.75,0.5 0.75,0 ; 1.25,0 0.75,0 ; -1.35,-0.4 ccw(c-1.05,-0.4) -1.05,-0.7 -0.45,-0.7 ccw(c-0.45,-0.4) -0.15,-0.4 -0.15,0.4 ccw(c-0.45,0.4) -0.45,0.7 -1.05,0.7 ccw(c-1.05,0.4) -1.35,0.4 -1.35,-0.4 ; -1.35,-0.1 ccw(c-0.75,-0.1) -0.15,-0.1 -0.15,0.1 ccw(c-0.75,0.1) -1.35,0.1 -1.35,-0.1 ; 0.15,-0.4 ccw(c0.45,-0.4) 0.45,-0.7 1.05,-0.7 ccw(c1.05,-0.4) 1.35,-0.4 1.35,0.4 ccw(c1.05,0.4) 1.05,0.7 0.45,0.7 ccw(c0.45,0.4) 0.15,0.4 0.15,-0.4 ; 0.15,-0.1 ccw(c0.75,-0.1) 1.35,-0.1 1.35,0.1 ccw(c0.75,0.1) 0.15,0.1 0.15,-0.1
Mechanical 14:
  circle w0.3: c-0.753,-1.228 r0.15
  lines w0.1: -2.25,-0.4 2.25,-0.4 ; -1.75,-0.4 -1.75,2.8 -1.05,2.8 -1.05,-0.4 ; -1.75,1.5 -1.05,1.5 ; -1.45,-0.4 -1.45,-1.4 -2.25,-1.4 -2.25,4.6 2.25,4.6 2.25,-1.4 1.45,-1.4 1.45,-0.4 ; 1.05,-0.4 1.05,2.8 1.75,2.8 1.75,-0.4 ; 1.05,1.5 1.75,1.5
3D body "JST_S2B-ZR(LF)(SN).stp": height 3.7, standoff -2.7, extent -2.25,-1.4 2.25,4.6